# Altium footprint library ref-packages.PCBLIB: 1543 footprints (part 77 of 103) (continued)
## SQFP-S-14X14-64 [mm]
pads (64):
  rect 0.5x1.8 smd: 1(-6,-8) 2(-5.2,-8) 3(-4.4,-8) 4(-3.6,-8) 5(-2.8,-8) 6(-2,-8) 7(-1.2,-8) 8(-0.4,-8) 9(0.4,-8) 10(1.2,-8) 11(2,-8) 12(2.8,-8) 13(3.6,-8) 14(4.4,-8) 15(5.2,-8) 16(6,-8) 33(6,8) 34(5.2,8) 35(4.4,8) 36(3.6,8) 37(2.8,8) 38(2,8) 39(1.2,8) 40(0.4,8) 41(-0.4,8) 42(-1.2,8) 43(-2,8) 44(-2.8,8) 45(-3.6,8) 46(-4.4,8) 47(-5.2,8) 48(-6,8)
  rect 1.8x0.5 smd: 17(8,-6) 18(8,-5.2) 19(8,-4.4) 20(8,-3.6) 21(8,-2.8) 22(8,-2) 23(8,-1.2) 24(8,-0.4) 25(8,0.4) 26(8,1.2) 27(8,2) 28(8,2.8) 29(8,3.6) 30(8,4.4) 31(8,5.2) 32(8,6) 49(-8,6) 50(-8,5.2) 51(-8,4.4) 52(-8,3.6) 53(-8,2.8) 54(-8,2) 55(-8,1.2) 56(-8,0.4) 57(-8,-0.4) 58(-8,-1.2) 59(-8,-2) 60(-8,-2.8) 61(-8,-3.6) 62(-8,-4.4) 63(-8,-5.2) 64(-8,-6)
Top Overlay:
  circle w0.254: c-5.5,-5.5 r0.75
  lines w0.203: -6.72,-6.71 6.71,-6.71 6.71,6.71 -6.72,6.71 -6.72,-6.71
Mechanical 16:
  rectangle: -6.22,-8.72 -5.78,-6.95
  rectangle: -5.42,-8.72 -4.98,-6.95
  rectangle: -4.62,-8.72 -4.18,-6.95
  rectangle: -3.82,-8.72 -3.38,-6.95
  rectangle: -3.02,-8.72 -2.58,-6.95
  rectangle: -2.22,-8.72 -1.78,-6.95
  rectangle: -1.42,-8.72 -0.98,-6.95
  rectangle: -0.62,-8.72 -0.18,-6.95
  rectangle: 0.18,-8.72 0.62,-6.95
  rectangle: 0.98,-8.72 1.42,-6.95
  rectangle: 1.78,-8.72 2.22,-6.95
  rectangle: 2.58,-8.72 3.02,-6.95
  rectangle: 3.38,-8.72 3.82,-6.95
  rectangle: 4.18,-8.72 4.62,-6.95
  rectangle: 4.98,-8.72 5.42,-6.95
  rectangle: 5.78,-8.72 6.22,-6.95
  rectangle: 6.95,-6.22 8.72,-5.78
  rectangle: 6.95,-5.42 8.72,-4.98
  rectangle: 6.95,-4.62 8.72,-4.18
  rectangle: 6.95,-3.82 8.72,-3.38
  rectangle: 6.95,-3.02 8.72,-2.58
  rectangle: 6.95,-2.22 8.72,-1.78
  rectangle: 6.95,-1.42 8.72,-0.98
  rectangle: 6.95,-0.62 8.72,-0.18
  rectangle: 6.95,0.18 8.72,0.62
  rectangle: 6.95,0.98 8.72,1.42
  rectangle: 6.95,1.78 8.72,2.22
  rectangle: 6.95,2.58 8.72,3.02
  rectangle: 6.95,3.38 8.72,3.82
  rectangle: 6.95,4.18 8.72,4.62
  rectangle: 6.95,4.98 8.72,5.42
  rectangle: 6.95,5.78 8.72,6.22
  rectangle: 5.78,6.95 6.22,8.72
  rectangle: 4.98,6.95 5.42,8.72
  rectangle: 4.18,6.95 4.62,8.72
  rectangle: 3.38,6.95 3.82,8.72
  rectangle: 2.58,6.95 3.02,8.72
  rectangle: 1.78,6.95 2.22,8.72
  rectangle: 0.98,6.95 1.42,8.72
  rectangle: 0.18,6.95 0.62,8.72
  rectangle: -0.62,6.95 -0.18,8.72
  rectangle: -1.42,6.95 -0.98,8.72
  rectangle: -2.22,6.95 -1.78,8.72
  rectangle: -3.02,6.95 -2.58,8.72
  rectangle: -3.82,6.95 -3.38,8.72
  rectangle: -4.62,6.95 -4.18,8.72
  rectangle: -5.42,6.95 -4.98,8.72
  rectangle: -6.22,6.95 -5.78,8.72
  rectangle: -8.72,5.78 -6.95,6.22
  rectangle: -8.72,4.98 -6.95,5.42
  rectangle: -8.72,4.18 -6.95,4.62
  rectangle: -8.72,3.38 -6.95,3.82
  rectangle: -8.72,2.58 -6.95,3.02
  rectangle: -8.72,1.78 -6.95,2.22
  rectangle: -8.72,0.98 -6.95,1.42
  rectangle: -8.72,0.18 -6.95,0.62
  rectangle: -8.72,-0.62 -6.95,-0.18
  rectangle: -8.72,-1.42 -6.95,-0.98
  rectangle: -8.72,-2.22 -6.95,-1.78
  rectangle: -8.72,-3.02 -6.95,-2.58
  rectangle: -8.72,-3.82 -6.95,-3.38
  rectangle: -8.72,-4.62 -6.95,-4.18
  rectangle: -8.72,-5.42 -6.95,-4.98
  rectangle: -8.72,-6.22 -6.95,-5.78
  lines w0.203: -6.91,-6.91 6.91,-6.91 6.91,6.91 -6.91,6.91 -6.91,-6.91
Mechanical 27:
  lines w0.2: -9.4,-9.4 -9.4,9.4 9.4,9.4 9.4,-9.4 -9.4,-9.4

## SQFP-S-14X14-80 [mm]
pads (80):
  rect 0.4x1.8 smd: 1(-6.175,-8) 2(-5.525,-8) 3(-4.875,-8) 4(-4.225,-8) 5(-3.575,-8) 6(-2.925,-8) 7(-2.275,-8) 8(-1.625,-8) 9(-0.975,-8) 10(-0.325,-8) 11(0.325,-8) 12(0.975,-8) 13(1.625,-8) 14(2.275,-8) 15(2.925,-8) 16(3.575,-8) 17(4.225,-8) 18(4.875,-8) 19(5.525,-8) 20(6.175,-8) 41(6.175,8) 42(5.525,8) 43(4.875,8) 44(4.225,8) 45(3.575,8) 46(2.925,8) 47(2.275,8) 48(1.625,8) 49(0.975,8) 50(0.325,8) 51(-0.325,8) 52(-0.975,8) 53(-1.625,8) 54(-2.275,8) 55(-2.925,8) 56(-3.575,8) 57(-4.225,8) 58(-4.875,8) 59(-5.525,8) 60(-6.175,8)
  rect 1.8x0.4 smd: 21(8,-6.175) 22(8,-5.525) 23(8,-4.875) 24(8,-4.225) 25(8,-3.575) 26(8,-2.925) 27(8,-2.275) 28(8,-1.625) 29(8,-0.975) 30(8,-0.325) 31(8,0.325) 32(8,0.975) 33(8,1.625) 34(8,2.275) 35(8,2.925) 36(8,3.575) 37(8,4.225) 38(8,4.875) 39(8,5.525) 40(8,6.175) 61(-8,6.175) 62(-8,5.525) 63(-8,4.875) 64(-8,4.225) 65(-8,3.575) 66(-8,2.925) 67(-8,2.275) 68(-8,1.625) 69(-8,0.975) 70(-8,0.325) 71(-8,-0.325) 72(-8,-0.975) 73(-8,-1.625) 74(-8,-2.275) 75(-8,-2.925) 76(-8,-3.575) 77(-8,-4.225) 78(-8,-4.875) 79(-8,-5.525) 80(-8,-6.175)
Top Overlay:
  circle w0.254: c-5.5,-5.5 r0.75
  lines w0.203: -6.72,-6.71 6.71,-6.71 6.71,6.71 -6.72,6.71 -6.72,-6.71
Mechanical 16:
  rectangle: -6.365,-8.72 -5.985,-6.95
  rectangle: -5.715,-8.72 -5.335,-6.95
  rectangle: -5.065,-8.72 -4.685,-6.95
  rectangle: -4.415,-8.72 -4.035,-6.95
  rectangle: -3.765,-8.72 -3.385,-6.95
  rectangle: -3.115,-8.72 -2.735,-6.95
  rectangle: -2.465,-8.72 -2.085,-6.95
  rectangle: -1.815,-8.72 -1.435,-6.95
  rectangle: -1.165,-8.72 -0.785,-6.95
  rectangle: -0.515,-8.72 -0.135,-6.95
  rectangle: 0.135,-8.72 0.515,-6.95
  rectangle: 0.785,-8.72 1.165,-6.95
  rectangle: 1.435,-8.72 1.815,-6.95
  rectangle: 2.085,-8.72 2.465,-6.95
  rectangle: 2.735,-8.72 3.115,-6.95
  rectangle: 3.385,-8.72 3.765,-6.95
  rectangle: 4.035,-8.72 4.415,-6.95
  rectangle: 4.685,-8.72 5.065,-6.95
  rectangle: 5.335,-8.72 5.715,-6.95
  rectangle: 5.985,-8.72 6.365,-6.95
  rectangle: 6.95,-6.365 8.72,-5.985
  rectangle: 6.95,-5.715 8.72,-5.335
  rectangle: 6.95,-5.065 8.72,-4.685
  rectangle: 6.95,-4.415 8.72,-4.035
  rectangle: 6.95,-3.765 8.72,-3.385
  rectangle: 6.95,-3.115 8.72,-2.735
  rectangle: 6.95,-2.465 8.72,-2.085
  rectangle: 6.95,-1.815 8.72,-1.435
  rectangle: 6.95,-1.165 8.72,-0.785
  rectangle: 6.95,-0.515 8.72,-0.135
  rectangle: 6.95,0.135 8.72,0.515
  rectangle: 6.95,0.785 8.72,1.165
  rectangle: 6.95,1.435 8.72,1.815
  rectangle: 6.95,2.085 8.72,2.465
  rectangle: 6.95,2.735 8.72,3.115
  rectangle: 6.95,3.385 8.72,3.765
  rectangle: 6.95,4.035 8.72,4.415
  rectangle: 6.95,4.685 8.72,5.065
  rectangle: 6.95,5.335 8.72,5.715
  rectangle: 6.95,5.985 8.72,6.365
  rectangle: 5.985,6.95 6.365,8.72
  rectangle: 5.335,6.95 5.715,8.72
  rectangle: 4.685,6.95 5.065,8.72
  rectangle: 4.035,6.95 4.415,8.72
  rectangle: 3.385,6.95 3.765,8.72
  rectangle: 2.735,6.95 3.115,8.72
  rectangle: 2.085,6.95 2.465,8.72
  rectangle: 1.435,6.95 1.815,8.72
  rectangle: 0.785,6.95 1.165,8.72
  rectangle: 0.135,6.95 0.515,8.72
  rectangle: -0.515,6.95 -0.135,8.72
  rectangle: -1.165,6.95 -0.785,8.72
  rectangle: -1.815,6.95 -1.435,8.72
  rectangle: -2.465,6.95 -2.085,8.72
  rectangle: -3.115,6.95 -2.735,8.72
  rectangle: -3.765,6.95 -3.385,8.72
  rectangle: -4.415,6.95 -4.035,8.72
  rectangle: -5.065,6.95 -4.685,8.72
  rectangle: -5.715,6.95 -5.335,8.72
  rectangle: -6.365,6.95 -5.985,8.72
  rectangle: -8.72,5.985 -6.95,6.365
  rectangle: -8.72,5.335 -6.95,5.715
  rectangle: -8.72,4.685 -6.95,5.065
  rectangle: -8.72,4.035 -6.95,4.415
  rectangle: -8.72,3.385 -6.95,3.765
  rectangle: -8.72,2.735 -6.95,3.115
  rectangle: -8.72,2.085 -6.95,2.465
  rectangle: -8.72,1.435 -6.95,1.815
  rectangle: -8.72,0.785 -6.95,1.165
  rectangle: -8.72,0.135 -6.95,0.515
  rectangle: -8.72,-0.515 -6.95,-0.135
  rectangle: -8.72,-1.165 -6.95,-0.785
  rectangle: -8.72,-1.815 -6.95,-1.435
  rectangle: -8.72,-2.465 -6.95,-2.085
  rectangle: -8.72,-3.115 -6.95,-2.735
  rectangle: -8.72,-3.765 -6.95,-3.385
  rectangle: -8.72,-4.415 -6.95,-4.035
  rectangle: -8.72,-5.065 -6.95,-4.685
  rectangle: -8.72,-5.715 -6.95,-5.335
  rectangle: -8.72,-6.365 -6.95,-5.985
  lines w0.203: -6.91,-6.91 6.91,-6.91 6.91,6.91 -6.91,6.91 -6.91,-6.91
Mechanical 27:
  lines w0.2: -9.4,-9.4 -9.4,9.4 9.4,9.4 9.4,-9.4 -9.4,-9.4

## SQFP-S-14X14-100 [mm]
pads (100):
  rect 0.3x1.6 smd: 1(-6,-7.6) 2(-5.5,-7.6) 3(-5,-7.6) 4(-4.5,-7.6) 5(-4,-7.6) 6(-3.5,-7.6) 7(-3,-7.6) 8(-2.5,-7.6) 9(-2,-7.6) 10(-1.5,-7.6) 11(-1,-7.6) 12(-0.5,-7.6) 13(0,-7.6) 14(0.5,-7.6) 15(1,-7.6) 16(1.5,-7.6) 17(2,-7.6) 18(2.5,-7.6) 19(3,-7.6) 20(3.5,-7.6) 21(4,-7.6) 22(4.5,-7.6) 23(5,-7.6) 24(5.5,-7.6) 25(6,-7.6) 51(6,7.6) 52(5.5,7.6) 53(5,7.6) 54(4.5,7.6) 55(4,7.6) 56(3.5,7.6) 57(3,7.6) 58(2.5,7.6) 59(2,7.6) 60(1.5,7.6) 61(1,7.6) 62(0.5,7.6) 63(0,7.6) 64(-0.5,7.6) 65(-1,7.6) 66(-1.5,7.6) 67(-2,7.6) 68(-2.5,7.6) 69(-3,7.6) 70(-3.5,7.6) 71(-4,7.6) 72(-4.5,7.6) 73(-5,7.6) 74(-5.5,7.6) 75(-6,7.6)
  rect 1.6x0.3 smd: 26(7.6,-6) 27(7.6,-5.5) 28(7.6,-5) 29(7.6,-4.5) 30(7.6,-4) 31(7.6,-3.5) 32(7.6,-3) 33(7.6,-2.5) 34(7.6,-2) 35(7.6,-1.5) 36(7.6,-1) 37(7.6,-0.5) 38(7.6,0) 39(7.6,0.5) 40(7.6,1) 41(7.6,1.5) 42(7.6,2) 43(7.6,2.5) 44(7.6,3) 45(7.6,3.5) 46(7.6,4) 47(7.6,4.5) 48(7.6,5) 49(7.6,5.5) 50(7.6,6) 76(-7.6,6) 77(-7.6,5.5) 78(-7.6,5) 79(-7.6,4.5) 80(-7.6,4) 81(-7.6,3.5) 82(-7.6,3) 83(-7.6,2.5) 84(-7.6,2) 85(-7.6,1.5) 86(-7.6,1) 87(-7.6,0.5) 88(-7.6,0) 89(-7.6,-0.5) 90(-7.6,-1) 91(-7.6,-1.5) 92(-7.6,-2) 93(-7.6,-2.5) 94(-7.6,-3) 95(-7.6,-3.5) 96(-7.6,-4) 97(-7.6,-4.5) 98(-7.6,-5) 99(-7.6,-5.5) 100(-7.6,-6)
Top Overlay:
  circle w0.254: c-5.5,-5.5 r0.75
  lines w0.203: -6.72,-6.71 6.71,-6.71 6.71,6.71 -6.72,6.71 -6.72,-6.71
Mechanical 16:
  rectangle: -6.15,-7.9 -5.85,-6.95
  rectangle: -5.65,-7.9 -5.35,-6.95
  rectangle: -5.15,-7.9 -4.85,-6.95
  rectangle: -4.65,-7.9 -4.35,-6.95
  rectangle: -4.15,-7.9 -3.85,-6.95
  rectangle: -3.65,-7.9 -3.35,-6.95
  rectangle: -3.15,-7.9 -2.85,-6.95
  rectangle: -2.65,-7.9 -2.35,-6.95
  rectangle: -2.15,-7.9 -1.85,-6.95
  rectangle: -1.65,-7.9 -1.35,-6.95
  rectangle: -1.15,-7.9 -0.85,-6.95
  rectangle: -0.65,-7.9 -0.35,-6.95
  rectangle: -0.15,-7.9 0.15,-6.95
  rectangle: 0.35,-7.9 0.65,-6.95
  rectangle: 0.85,-7.9 1.15,-6.95
  rectangle: 1.35,-7.9 1.65,-6.95
  rectangle: 1.85,-7.9 2.15,-6.95
  rectangle: 2.35,-7.9 2.65,-6.95
  rectangle: 2.85,-7.9 3.15,-6.95
  rectangle: 3.35,-7.9 3.65,-6.95
  rectangle: 3.85,-7.9 4.15,-6.95
  rectangle: 4.35,-7.9 4.65,-6.95
  rectangle: 4.85,-7.9 5.15,-6.95
  rectangle: 5.35,-7.9 5.65,-6.95
  rectangle: 5.85,-7.9 6.15,-6.95
  rectangle: 6.95,-6.15 7.9,-5.85
  rectangle: 6.95,-5.65 7.9,-5.35
  rectangle: 6.95,-5.15 7.9,-4.85
  rectangle: 6.95,-4.65 7.9,-4.35
  rectangle: 6.95,-4.15 7.9,-3.85
  rectangle: 6.95,-3.65 7.9,-3.35
  rectangle: 6.95,-3.15 7.9,-2.85
  rectangle: 6.95,-2.65 7.9,-2.35
  rectangle: 6.95,-2.15 7.9,-1.85
  rectangle: 6.95,-1.65 7.9,-1.35
  rectangle: 6.95,-1.15 7.9,-0.85
  rectangle: 6.95,-0.65 7.9,-0.35
  rectangle: 6.95,-0.15 7.9,0.15
  rectangle: 6.95,0.35 7.9,0.65
  rectangle: 6.95,0.85 7.9,1.15
  rectangle: 6.95,1.35 7.9,1.65
  rectangle: 6.95,1.85 7.9,2.15
  rectangle: 6.95,2.35 7.9,2.65
  rectangle: 6.95,2.85 7.9,3.15
  rectangle: 6.95,3.35 7.9,3.65
  rectangle: 6.95,3.85 7.9,4.15
  rectangle: 6.95,4.35 7.9,4.65
  rectangle: 6.95,4.85 7.9,5.15
  rectangle: 6.95,5.35 7.9,5.65
  rectangle: 6.95,5.85 7.9,6.15
  rectangle: 5.85,6.95 6.15,7.9
  rectangle: 5.35,6.95 5.65,7.9
  rectangle: 4.85,6.95 5.15,7.9
  rectangle: 4.35,6.95 4.65,7.9
  rectangle: 3.85,6.95 4.15,7.9
  rectangle: 3.35,6.95 3.65,7.9
  rectangle: 2.85,6.95 3.15,7.9
  rectangle: 2.35,6.95 2.65,7.9
  rectangle: 1.85,6.95 2.15,7.9
  rectangle: 1.35,6.95 1.65,7.9
  rectangle: 0.85,6.95 1.15,7.9
  rectangle: 0.35,6.95 0.65,7.9
  rectangle: -0.15,6.95 0.15,7.9
  rectangle: -0.65,6.95 -0.35,7.9
  rectangle: -1.15,6.95 -0.85,7.9
  rectangle: -1.65,6.95 -1.35,7.9
  rectangle: -2.15,6.95 -1.85,7.9
  rectangle: -2.65,6.95 -2.35,7.9
  rectangle: -3.15,6.95 -2.85,7.9
  rectangle: -3.65,6.95 -3.35,7.9
  rectangle: -4.15,6.95 -3.85,7.9
  rectangle: -4.65,6.95 -4.35,7.9
  rectangle: -5.15,6.95 -4.85,7.9
  rectangle: -5.65,6.95 -5.35,7.9
  rectangle: -6.15,6.95 -5.85,7.9
  rectangle: -7.9,5.85 -6.95,6.15
  rectangle: -7.9,5.35 -6.95,5.65
  rectangle: -7.9,4.85 -6.95,5.15
  rectangle: -7.9,4.35 -6.95,4.65
  rectangle: -7.9,3.85 -6.95,4.15
  rectangle: -7.9,3.35 -6.95,3.65
  rectangle: -7.9,2.85 -6.95,3.15
  rectangle: -7.9,2.35 -6.95,2.65
  rectangle: -7.9,1.85 -6.95,2.15
  rectangle: -7.9,1.35 -6.95,1.65
  rectangle: -7.9,0.85 -6.95,1.15
  rectangle: -7.9,0.35 -6.95,0.65
  rectangle: -7.9,-0.15 -6.95,0.15
  rectangle: -7.9,-0.65 -6.95,-0.35
  rectangle: -7.9,-1.15 -6.95,-0.85
  rectangle: -7.9,-1.65 -6.95,-1.35
  rectangle: -7.9,-2.15 -6.95,-1.85
  rectangle: -7.9,-2.65 -6.95,-2.35
  rectangle: -7.9,-3.15 -6.95,-2.85
  rectangle: -7.9,-3.65 -6.95,-3.35
  rectangle: -7.9,-4.15 -6.95,-3.85
  rectangle: -7.9,-4.65 -6.95,-4.35
  rectangle: -7.9,-5.15 -6.95,-4.85
  rectangle: -7.9,-5.65 -6.95,-5.35
  rectangle: -7.9,-6.15 -6.95,-5.85
  lines w0.203: -6.91,-6.91 6.91,-6.91 6.91,6.91 -6.91,6.91 -6.91,-6.91
Mechanical 27:
  lines w0.2: -8.9,-8.9 -8.9,8.9 8.9,8.9 8.9,-8.9 -8.9,-8.9

## SQFP-S-14X14-108 [mm]
pads (108):
  rect 0.3x1.6 smd: 1(-6.5,-7.6) 2(-6,-7.6) 3(-5.5,-7.6) 4(-5,-7.6) 5(-4.5,-7.6) 6(-4,-7.6) 7(-3.5,-7.6) 8(-3,-7.6) 9(-2.5,-7.6) 10(-2,-7.6) 11(-1.5,-7.6) 12(-1,-7.6) 13(-0.5,-7.6) 14(0,-7.6) 15(0.5,-7.6) 16(1,-7.6) 17(1.5,-7.6) 18(2,-7.6) 19(2.5,-7.6) 20(3,-7.6) 21(3.5,-7.6) 22(4,-7.6) 23(4.5,-7.6) 24(5,-7.6) 25(5.5,-7.6) 26(6,-7.6) 27(6.5,-7.6) 55(6.5,7.6) 56(6,7.6) 57(5.5,7.6) 58(5,7.6) 59(4.5,7.6) 60(4,7.6) 61(3.5,7.6) 62(3,7.6) 63(2.5,7.6) 64(2,7.6) 65(1.5,7.6) 66(1,7.6) 67(0.5,7.6) 68(0,7.6) 69(-0.5,7.6) 70(-1,7.6) 71(-1.5,7.6) 72(-2,7.6) 73(-2.5,7.6) 74(-3,7.6) 75(-3.5,7.6) 76(-4,7.6) 77(-4.5,7.6) 78(-5,7.6) 79(-5.5,7.6) 80(-6,7.6) 81(-6.5,7.6)
  rect 1.6x0.3 smd: 28(7.6,-6.5) 29(7.6,-6) 30(7.6,-5.5) 31(7.6,-5) 32(7.6,-4.5) 33(7.6,-4) 34(7.6,-3.5) 35(7.6,-3) 36(7.6,-2.5) 37(7.6,-2) 38(7.6,-1.5) 39(7.6,-1) 40(7.6,-0.5) 41(7.6,0) 42(7.6,0.5) 43(7.6,1) 44(7.6,1.5) 45(7.6,2) 46(7.6,2.5) 47(7.6,3) 48(7.6,3.5) 49(7.6,4) 50(7.6,4.5) 51(7.6,5) 52(7.6,5.5) 53(7.6,6) 54(7.6,6.5) 82(-7.6,6.5) 83(-7.6,6) 84(-7.6,5.5) 85(-7.6,5) 86(-7.6,4.5) 87(-7.6,4) 88(-7.6,3.5) 89(-7.6,3) 90(-7.6,2.5) 91(-7.6,2) 92(-7.6,1.5) 93(-7.6,1) 94(-7.6,0.5) 95(-7.6,0) 96(-7.6,-0.5) 97(-7.6,-1) 98(-7.6,-1.5) 99(-7.6,-2) 100(-7.6,-2.5) 101(-7.6,-3) 102(-7.6,-3.5) 103(-7.6,-4) 104(-7.6,-4.5) 105(-7.6,-5) 106(-7.6,-5.5) 107(-7.6,-6) 108(-7.6,-6.5)
Top Overlay:
  circle w0.254: c-5.5,-5.5 r0.75
  lines w0.203: -6.72,-6.71 6.71,-6.71 6.71,6.71 -6.72,6.71 -6.72,-6.71
Mechanical 16:
  rectangle: -6.65,-7.9 -6.35,-6.95
  rectangle: -6.15,-7.9 -5.85,-6.95
  rectangle: -5.65,-7.9 -5.35,-6.95
  rectangle: -5.15,-7.9 -4.85,-6.95
  rectangle: -4.65,-7.9 -4.35,-6.95
  rectangle: -4.15,-7.9 -3.85,-6.95
  rectangle: -3.65,-7.9 -3.35,-6.95
  rectangle: -3.15,-7.9 -2.85,-6.95
  rectangle: -2.65,-7.9 -2.35,-6.95
  rectangle: -2.15,-7.9 -1.85,-6.95
  rectangle: -1.65,-7.9 -1.35,-6.95
  rectangle: -1.15,-7.9 -0.85,-6.95
  rectangle: -0.65,-7.9 -0.35,-6.95
  rectangle: -0.15,-7.9 0.15,-6.95
  rectangle: 0.35,-7.9 0.65,-6.95
  rectangle: 0.85,-7.9 1.15,-6.95
  rectangle: 1.35,-7.9 1.65,-6.95
  rectangle: 1.85,-7.9 2.15,-6.95
  rectangle: 2.35,-7.9 2.65,-6.95
  rectangle: 2.85,-7.9 3.15,-6.95
  rectangle: 3.35,-7.9 3.65,-6.95
  rectangle: 3.85,-7.9 4.15,-6.95
  rectangle: 4.35,-7.9 4.65,-6.95
  rectangle: 4.85,-7.9 5.15,-6.95
  rectangle: 5.35,-7.9 5.65,-6.95
  rectangle: 5.85,-7.9 6.15,-6.95
  rectangle: 6.35,-7.9 6.65,-6.95
  rectangle: 6.95,-6.65 7.9,-6.35
  rectangle: 6.95,-6.15 7.9,-5.85
  rectangle: 6.95,-5.65 7.9,-5.35
  rectangle: 6.95,-5.15 7.9,-4.85
  rectangle: 6.95,-4.65 7.9,-4.35
  rectangle: 6.95,-4.15 7.9,-3.85
  rectangle: 6.95,-3.65 7.9,-3.35
  rectangle: 6.95,-3.15 7.9,-2.85
  rectangle: 6.95,-2.65 7.9,-2.35
  rectangle: 6.95,-2.15 7.9,-1.85
  rectangle: 6.95,-1.65 7.9,-1.35
  rectangle: 6.95,-1.15 7.9,-0.85
  rectangle: 6.95,-0.65 7.9,-0.35
  rectangle: 6.95,-0.15 7.9,0.15
  rectangle: 6.95,0.35 7.9,0.65
  rectangle: 6.95,0.85 7.9,1.15
  rectangle: 6.95,1.35 7.9,1.65
  rectangle: 6.95,1.85 7.9,2.15
  rectangle: 6.95,2.35 7.9,2.65
  rectangle: 6.95,2.85 7.9,3.15
  rectangle: 6.95,3.35 7.9,3.65
  rectangle: 6.95,3.85 7.9,4.15
  rectangle: 6.95,4.35 7.9,4.65
  rectangle: 6.95,4.85 7.9,5.15
  rectangle: 6.95,5.35 7.9,5.65
  rectangle: 6.95,5.85 7.9,6.15
  rectangle: 6.95,6.35 7.9,6.65
  rectangle: 6.35,6.95 6.65,7.9
  rectangle: 5.85,6.95 6.15,7.9
  rectangle: 5.35,6.95 5.65,7.9
  rectangle: 4.85,6.95 5.15,7.9
  rectangle: 4.35,6.95 4.65,7.9
  rectangle: 3.85,6.95 4.15,7.9
  rectangle: 3.35,6.95 3.65,7.9
  rectangle: 2.85,6.95 3.15,7.9
  rectangle: 2.35,6.95 2.65,7.9
  rectangle: 1.85,6.95 2.15,7.9
  rectangle: 1.35,6.95 1.65,7.9
  rectangle: 0.85,6.95 1.15,7.9
  rectangle: 0.35,6.95 0.65,7.9
  rectangle: -0.15,6.95 0.15,7.9
  rectangle: -0.65,6.95 -0.35,7.9
  rectangle: -1.15,6.95 -0.85,7.9
  rectangle: -1.65,6.95 -1.35,7.9
  rectangle: -2.15,6.95 -1.85,7.9
  rectangle: -2.65,6.95 -2.35,7.9
  rectangle: -3.15,6.95 -2.85,7.9
  rectangle: -3.65,6.95 -3.35,7.9
  rectangle: -4.15,6.95 -3.85,7.9
  rectangle: -4.65,6.95 -4.35,7.9
  rectangle: -5.15,6.95 -4.85,7.9
  rectangle: -5.65,6.95 -5.35,7.9
  rectangle: -6.15,6.95 -5.85,7.9
  rectangle: -6.65,6.95 -6.35,7.9
  rectangle: -7.9,6.35 -6.95,6.65
  rectangle: -7.9,5.85 -6.95,6.15
  rectangle: -7.9,5.35 -6.95,5.65
  rectangle: -7.9,4.85 -6.95,5.15
  rectangle: -7.9,4.35 -6.95,4.65
  rectangle: -7.9,3.85 -6.95,4.15
  rectangle: -7.9,3.35 -6.95,3.65
  rectangle: -7.9,2.85 -6.95,3.15
  rectangle: -7.9,2.35 -6.95,2.65
  rectangle: -7.9,1.85 -6.95,2.15
  rectangle: -7.9,1.35 -6.95,1.65
  rectangle: -7.9,0.85 -6.95,1.15
  rectangle: -7.9,0.35 -6.95,0.65
  rectangle: -7.9,-0.15 -6.95,0.15
  rectangle: -7.9,-0.65 -6.95,-0.35
  rectangle: -7.9,-1.15 -6.95,-0.85
  rectangle: -7.9,-1.65 -6.95,-1.35
  rectangle: -7.9,-2.15 -6.95,-1.85
  rectangle: -7.9,-2.65 -6.95,-2.35
  rectangle: -7.9,-3.15 -6.95,-2.85
  rectangle: -7.9,-3.65 -6.95,-3.35
  rectangle: -7.9,-4.15 -6.95,-3.85
  rectangle: -7.9,-4.65 -6.95,-4.35
  rectangle: -7.9,-5.15 -6.95,-4.85
  rectangle: -7.9,-5.65 -6.95,-5.35
  rectangle: -7.9,-6.15 -6.95,-5.85
  rectangle: -7.9,-6.65 -6.95,-6.35
  lines w0.203: -6.91,-6.91 6.91,-6.91 6.91,6.91 -6.91,6.91 -6.91,-6.91
Mechanical 27:
  lines w0.2: -8.9,-8.9 -8.9,8.9 8.9,8.9 8.9,-8.9 -8.9,-8.9

## SQFP-S-14X14-120 [mm]
pads (120):
  rect 0.25x1.6 smd: 1(-5.8,-7.6) 2(-5.4,-7.6) 3(-5,-7.6) 4(-4.6,-7.6) 5(-4.2,-7.6) 6(-3.8,-7.6) 7(-3.4,-7.6) 8(-3,-7.6) 9(-2.6,-7.6) 10(-2.2,-7.6) 11(-1.8,-7.6) 12(-1.4,-7.6) 13(-1,-7.6) 14(-0.6,-7.6) 15(-0.2,-7.6) 16(0.2,-7.6) 17(0.6,-7.6) 18(1,-7.6) 19(1.4,-7.6) 20(1.8,-7.6) 21(2.2,-7.6) 22(2.6,-7.6) 23(3,-7.6) 24(3.4,-7.6) 25(3.8,-7.6) 26(4.2,-7.6) 27(4.6,-7.6) 28(5,-7.6) 29(5.4,-7.6) 30(5.8,-7.6) 61(5.8,7.6) 62(5.4,7.6) 63(5,7.6) 64(4.6,7.6) 65(4.2,7.6) 66(3.8,7.6) 67(3.4,7.6) 68(3,7.6) 69(2.6,7.6) 70(2.2,7.6) 71(1.8,7.6) 72(1.4,7.6) 73(1,7.6) 74(0.6,7.6) 75(0.2,7.6) 76(-0.2,7.6) 77(-0.6,7.6) 78(-1,7.6) 79(-1.4,7.6) 80(-1.8,7.6) 81(-2.2,7.6) 82(-2.6,7.6) 83(-3,7.6) 84(-3.4,7.6) 85(-3.8,7.6) 86(-4.2,7.6) 87(-4.6,7.6) 88(-5,7.6) 89(-5.4,7.6) 90(-5.8,7.6)
  rect 1.6x0.25 smd: 31(7.6,-5.8) 32(7.6,-5.4) 33(7.6,-5) 34(7.6,-4.6) 35(7.6,-4.2) 36(7.6,-3.8) 37(7.6,-3.4) 38(7.6,-3) 39(7.6,-2.6) 40(7.6,-2.2) 41(7.6,-1.8) 42(7.6,-1.4) 43(7.6,-1) 44(7.6,-0.6) 45(7.6,-0.2) 46(7.6,0.2) 47(7.6,0.6) 48(7.6,1) 49(7.6,1.4) 50(7.6,1.8) 51(7.6,2.2) 52(7.6,2.6) 53(7.6,3) 54(7.6,3.4) 55(7.6,3.8) 56(7.6,4.2) 57(7.6,4.6) 58(7.6,5) 59(7.6,5.4) 60(7.6,5.8) 91(-7.6,5.8) 92(-7.6,5.4) 93(-7.6,5) 94(-7.6,4.6) 95(-7.6,4.2) 96(-7.6,3.8) 97(-7.6,3.4) 98(-7.6,3) 99(-7.6,2.6) 100(-7.6,2.2) 101(-7.6,1.8) 102(-7.6,1.4) 103(-7.6,1) 104(-7.6,0.6) 105(-7.6,0.2) 106(-7.6,-0.2) 107(-7.6,-0.6) 108(-7.6,-1) 109(-7.6,-1.4) 110(-7.6,-1.8) 111(-7.6,-2.2) 112(-7.6,-2.6) 113(-7.6,-3) 114(-7.6,-3.4) 115(-7.6,-3.8) 116(-7.6,-4.2) 117(-7.6,-4.6) 118(-7.6,-5) 119(-7.6,-5.4) 120(-7.6,-5.8)
Top Overlay:
  circle w0.254: c-5.5,-5.5 r0.75
  lines w0.203: -6.72,-6.71 6.71,-6.71 6.71,6.71 -6.72,6.71 -6.72,-6.71
Mechanical 16:
  rectangle: -5.91,-7.9 -5.69,-6.95
  rectangle: -5.51,-7.9 -5.29,-6.95
  rectangle: -5.11,-7.9 -4.89,-6.95
  rectangle: -4.71,-7.9 -4.49,-6.95
  rectangle: -4.31,-7.9 -4.09,-6.95
  rectangle: -3.91,-7.9 -3.69,-6.95
  rectangle: -3.51,-7.9 -3.29,-6.95
  rectangle: -3.11,-7.9 -2.89,-6.95
  rectangle: -2.71,-7.9 -2.49,-6.95
  rectangle: -2.31,-7.9 -2.09,-6.95
  rectangle: -1.91,-7.9 -1.69,-6.95
  rectangle: -1.51,-7.9 -1.29,-6.95
  rectangle: -1.11,-7.9 -0.89,-6.95
  rectangle: -0.71,-7.9 -0.49,-6.95
  rectangle: -0.31,-7.9 -0.09,-6.95
  rectangle: 0.09,-7.9 0.31,-6.95
  rectangle: 0.49,-7.9 0.71,-6.95
  rectangle: 0.89,-7.9 1.11,-6.95
  rectangle: 1.29,-7.9 1.51,-6.95
  rectangle: 1.69,-7.9 1.91,-6.95
  rectangle: 2.09,-7.9 2.31,-6.95
  rectangle: 2.49,-7.9 2.71,-6.95
  rectangle: 2.89,-7.9 3.11,-6.95
  rectangle: 3.29,-7.9 3.51,-6.95
  rectangle: 3.69,-7.9 3.91,-6.95
  rectangle: 4.09,-7.9 4.31,-6.95
  rectangle: 4.49,-7.9 4.71,-6.95
  rectangle: 4.89,-7.9 5.11,-6.95
  rectangle: 5.29,-7.9 5.51,-6.95
  rectangle: 5.69,-7.9 5.91,-6.95
  rectangle: 6.95,-5.91 7.9,-5.69
  rectangle: 6.95,-5.51 7.9,-5.29
  rectangle: 6.95,-5.11 7.9,-4.89
  rectangle: 6.95,-4.71 7.9,-4.49
  rectangle: 6.95,-4.31 7.9,-4.09
  rectangle: 6.95,-3.91 7.9,-3.69
  rectangle: 6.95,-3.51 7.9,-3.29
  rectangle: 6.95,-3.11 7.9,-2.89
  rectangle: 6.95,-2.71 7.9,-2.49
  rectangle: 6.95,-2.31 7.9,-2.09
  rectangle: 6.95,-1.91 7.9,-1.69
  rectangle: 6.95,-1.51 7.9,-1.29
  rectangle: 6.95,-1.11 7.9,-0.89
  rectangle: 6.95,-0.71 7.9,-0.49
  rectangle: 6.95,-0.31 7.9,-0.09
  rectangle: 6.95,0.09 7.9,0.31
  rectangle: 6.95,0.49 7.9,0.71
  rectangle: 6.95,0.89 7.9,1.11
  rectangle: 6.95,1.29 7.9,1.51
  rectangle: 6.95,1.69 7.9,1.91
  rectangle: 6.95,2.09 7.9,2.31
  rectangle: 6.95,2.49 7.9,2.71
  rectangle: 6.95,2.89 7.9,3.11
  rectangle: 6.95,3.29 7.9,3.51
  rectangle: 6.95,3.69 7.9,3.91
  rectangle: 6.95,4.09 7.9,4.31
  rectangle: 6.95,4.49 7.9,4.71
  rectangle: 6.95,4.89 7.9,5.11
  rectangle: 6.95,5.29 7.9,5.51
  rectangle: 6.95,5.69 7.9,5.91
  rectangle: 5.69,6.95 5.91,7.9
  rectangle: 5.29,6.95 5.51,7.9
  rectangle: 4.89,6.95 5.11,7.9
  rectangle: 4.49,6.95 4.71,7.9
  rectangle: 4.09,6.95 4.31,7.9
  rectangle: 3.69,6.95 3.91,7.9
  rectangle: 3.29,6.95 3.51,7.9
  rectangle: 2.89,6.95 3.11,7.9
  rectangle: 2.49,6.95 2.71,7.9
  rectangle: 2.09,6.95 2.31,7.9
  rectangle: 1.69,6.95 1.91,7.9
  rectangle: 1.29,6.95 1.51,7.9
  rectangle: 0.89,6.95 1.11,7.9
  rectangle: 0.49,6.95 0.71,7.9
  rectangle: 0.09,6.95 0.31,7.9
  rectangle: -0.31,6.95 -0.09,7.9
  rectangle: -0.71,6.95 -0.49,7.9
  rectangle: -1.11,6.95 -0.89,7.9
  rectangle: -1.51,6.95 -1.29,7.9
  rectangle: -1.91,6.95 -1.69,7.9
  rectangle: -2.31,6.95 -2.09,7.9
  rectangle: -2.71,6.95 -2.49,7.9
  rectangle: -3.11,6.95 -2.89,7.9
  rectangle: -3.51,6.95 -3.29,7.9
  rectangle: -3.91,6.95 -3.69,7.9
  rectangle: -4.31,6.95 -4.09,7.9
  rectangle: -4.71,6.95 -4.49,7.9
  rectangle: -5.11,6.95 -4.89,7.9
  rectangle: -5.51,6.95 -5.29,7.9
  rectangle: -5.91,6.95 -5.69,7.9
  rectangle: -7.9,5.69 -6.95,5.91
  rectangle: -7.9,5.29 -6.95,5.51
  rectangle: -7.9,4.89 -6.95,5.11
  rectangle: -7.9,4.49 -6.95,4.71
  rectangle: -7.9,4.09 -6.95,4.31
  rectangle: -7.9,3.69 -6.95,3.91
  rectangle: -7.9,3.29 -6.95,3.51
  rectangle: -7.9,2.89 -6.95,3.11
  rectangle: -7.9,2.49 -6.95,2.71
  rectangle: -7.9,2.09 -6.95,2.31
  rectangle: -7.9,1.69 -6.95,1.91
  rectangle: -7.9,1.29 -6.95,1.51
  rectangle: -7.9,0.89 -6.95,1.11
  rectangle: -7.9,0.49 -6.95,0.71
  rectangle: -7.9,0.09 -6.95,0.31
  rectangle: -7.9,-0.31 -6.95,-0.09
  rectangle: -7.9,-0.71 -6.95,-0.49
  rectangle: -7.9,-1.11 -6.95,-0.89
  rectangle: -7.9,-1.51 -6.95,-1.29
  rectangle: -7.9,-1.91 -6.95,-1.69
  rectangle: -7.9,-2.31 -6.95,-2.09
  rectangle: -7.9,-2.71 -6.95,-2.49
  rectangle: -7.9,-3.11 -6.95,-2.89
  rectangle: -7.9,-3.51 -6.95,-3.29
  rectangle: -7.9,-3.91 -6.95,-3.69
  rectangle: -7.9,-4.31 -6.95,-4.09
  rectangle: -7.9,-4.71 -6.95,-4.49
  rectangle: -7.9,-5.11 -6.95,-4.89
  rectangle: -7.9,-5.51 -6.95,-5.29
  rectangle: -7.9,-5.91 -6.95,-5.69
  lines w0.203: -6.91,-6.91 6.91,-6.91 6.91,6.91 -6.91,6.91 -6.91,-6.91
Mechanical 27:
  lines w0.2: -8.9,-8.9 -8.9,8.9 8.9,8.9 8.9,-8.9 -8.9,-8.9